# Altium schematic symbol library jlcpcb_2025_04_capacitors_extended_0201.schlib: 1175 symbols (part 4 of 7)
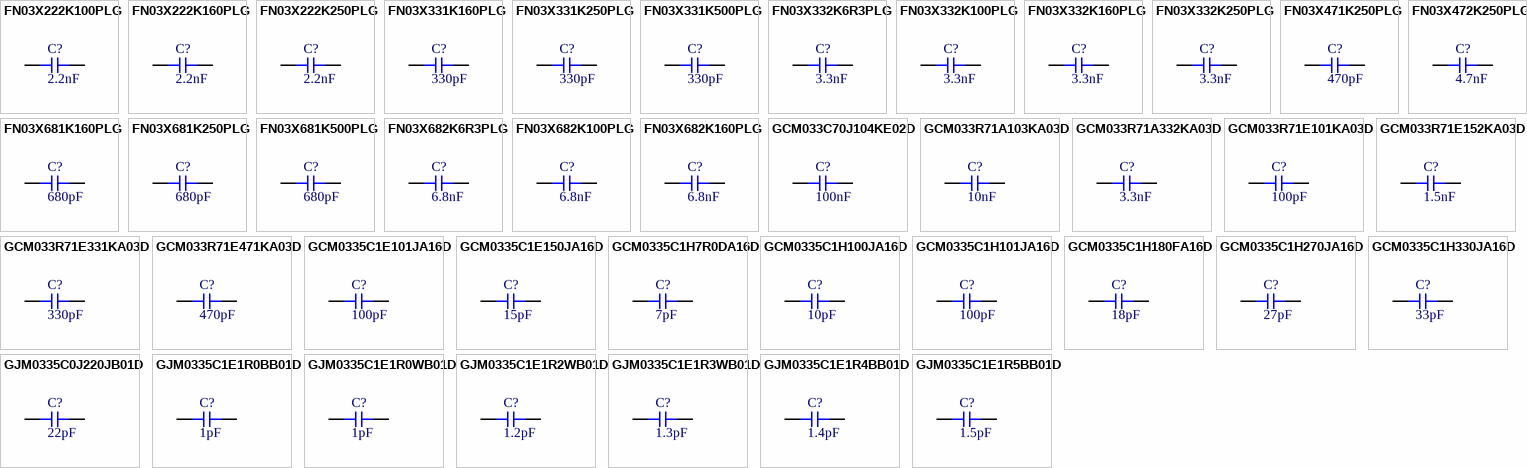
[diagram p32: symbols FN03X222K100PLG to GJM0335C1E1R5BB01D]

## GJM0335C1E1R0WB01D
designator C?  Capacitance: 1pF  (hidden comment: *)
Capacitor, Ceramic (MLCC), 1pF, 25V, C0G, SMD 0201; Manufacturer: Murata Electronics; Manufacturer Part Number: GJM0335C1E1R0WB01D; Package Size: 0201; JLCPCB Basic Part: No; JLCPCB Part Number: C185624; Supplier 1: LCSC; Category: Capacitors - MLCC; Supplier Part Number 1: C185624; Voltage Rating: 25V; Temperature Coefficient: C0G; RoHS: Yes; ComponentLink1Description: Datasheet; ComponentLink1URL: https://wmsc.lcsc.com/wmsc/upload/file/pdf/v2/lcsc/1811081545_Murata-Electronics-GJM0335C1E1R0WB01D_C185624.pdf; ComponentLink2Description: JLCPCB Part URL; ComponentLink2URL: https://jlcpcb.com/partdetail/C185624; ComponentLink3Description: LCSC Part URL; ComponentLink3URL: https://lcsc.com/product-detail/Multilayer-Ceramic-Capacitors-MLCC---SMD-SMT_Murata-Electronics-Murata-Electronics-GJM0335C1E1R0WB01D_C185624.html
footprint CAP-0201 (0201 (0603M) Capacitor)
pins: 1, 2

## GJM0335C1E1R2WB01D
designator C?  Capacitance: 1.2pF  (hidden comment: *)
Capacitor, Ceramic (MLCC), 1.2pF, 25V, null, SMD 0201; Manufacturer: Murata Electronics; Manufacturer Part Number: GJM0335C1E1R2WB01D; Package Size: 0201; JLCPCB Basic Part: No; JLCPCB Part Number: C710725; Supplier 1: LCSC; Category: Capacitors - MLCC; Supplier Part Number 1: C710725; Voltage Rating: 25V; Temperature Coefficient: null; RoHS: Yes; ComponentLink1Description: Datasheet; ComponentLink1URL: https://wmsc.lcsc.com/wmsc/upload/file/pdf/v2/lcsc/2009101807_Murata-Electronics-GJM0335C1E1R2WB01D_C710725.pdf; ComponentLink2Description: JLCPCB Part URL; ComponentLink2URL: https://jlcpcb.com/partdetail/C710725; ComponentLink3Description: LCSC Part URL; ComponentLink3URL: https://lcsc.com/product-detail/Multilayer-Ceramic-Capacitors-MLCC---SMD-SMT_Murata-Electronics-Murata-Electronics-GJM0335C1E1R2WB01D_C710725.html
footprint CAP-0201 (0201 (0603M) Capacitor)
pins: 1, 2

## GJM0335C1E1R3WB01D
designator C?  Capacitance: 1.3pF  (hidden comment: *)
Capacitor, Ceramic (MLCC), 1.3pF, 25V, null, SMD 0201; Manufacturer: Murata Electronics; Manufacturer Part Number: GJM0335C1E1R3WB01D; Package Size: 0201; JLCPCB Basic Part: No; JLCPCB Part Number: C710726; Supplier 1: LCSC; Category: Capacitors - MLCC; Supplier Part Number 1: C710726; Voltage Rating: 25V; Temperature Coefficient: null; RoHS: Yes; ComponentLink1Description: Datasheet; ComponentLink1URL: https://wmsc.lcsc.com/wmsc/upload/file/pdf/v2/lcsc/2103241949_Murata-Electronics-GJM0335C1E1R3WB01D_C710726.pdf; ComponentLink2Description: JLCPCB Part URL; ComponentLink2URL: https://jlcpcb.com/partdetail/C710726; ComponentLink3Description: LCSC Part URL; ComponentLink3URL: https://lcsc.com/product-detail/Multilayer-Ceramic-Capacitors-MLCC---SMD-SMT_Murata-Electronics-Murata-Electronics-GJM0335C1E1R3WB01D_C710726.html
footprint CAP-0201 (0201 (0603M) Capacitor)
pins: 1, 2

## GJM0335C1E1R4BB01D
designator C?  Capacitance: 1.4pF  (hidden comment: *)
Capacitor, Ceramic (MLCC), 1.4pF, 25V, C0G, SMD 0201; Manufacturer: Murata Electronics; Manufacturer Part Number: GJM0335C1E1R4BB01D; Package Size: 0201; JLCPCB Basic Part: No; JLCPCB Part Number: C711578; Supplier 1: LCSC; Category: Capacitors - MLCC; Supplier Part Number 1: C711578; Voltage Rating: 25V; Temperature Coefficient: C0G; RoHS: Yes; ComponentLink1Description: Datasheet; ComponentLink1URL: https://wmsc.lcsc.com/wmsc/upload/file/pdf/v2/lcsc/2008261937_Murata-Electronics-GJM0335C1E1R4BB01D_C711578.pdf; ComponentLink2Description: JLCPCB Part URL; ComponentLink2URL: https://jlcpcb.com/partdetail/C711578; ComponentLink3Description: LCSC Part URL; ComponentLink3URL: https://lcsc.com/product-detail/Multilayer-Ceramic-Capacitors-MLCC---SMD-SMT_Murata-Electronics-Murata-Electronics-GJM0335C1E1R4BB01D_C711578.html
footprint CAP-0201 (0201 (0603M) Capacitor)
pins: 1, 2

## GJM0335C1E1R5BB01D
designator C?  Capacitance: 1.5pF  (hidden comment: *)
Capacitor, Ceramic (MLCC), 1.5pF, 25V, C0G, SMD 0201; Manufacturer: Murata Electronics; Manufacturer Part Number: GJM0335C1E1R5BB01D; Package Size: 0201; JLCPCB Basic Part: No; JLCPCB Part Number: C161283; Supplier 1: LCSC; Category: Capacitors - MLCC; Supplier Part Number 1: C161283; Voltage Rating: 25V; Temperature Coefficient: C0G; RoHS: Yes; ComponentLink1Description: Datasheet; ComponentLink1URL: https://wmsc.lcsc.com/wmsc/upload/file/pdf/v2/lcsc/2304140030_Murata-Electronics-GJM0335C1E1R5BB01D_C161283.pdf; ComponentLink2Description: JLCPCB Part URL; ComponentLink2URL: https://jlcpcb.com/partdetail/C161283; ComponentLink3Description: LCSC Part URL; ComponentLink3URL: https://lcsc.com/product-detail/Multilayer-Ceramic-Capacitors-MLCC---SMD-SMT_Murata-Electronics-Murata-Electronics-GJM0335C1E1R5BB01D_C161283.html
footprint CAP-0201 (0201 (0603M) Capacitor)
pins: 1, 2

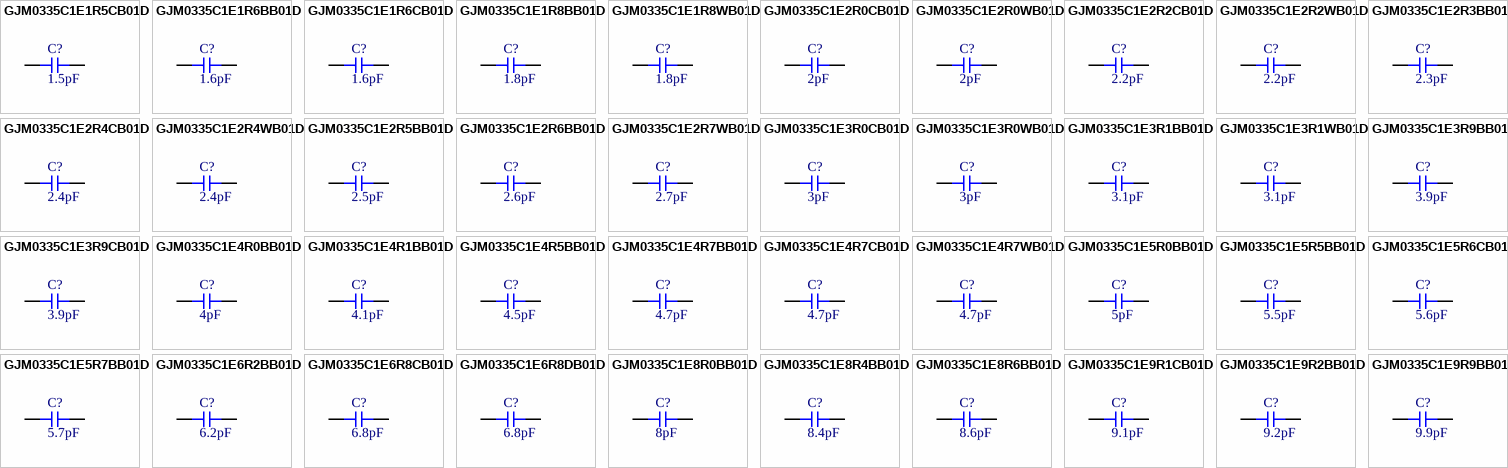
[diagram p14: symbols GJM0335C1E1R5CB01D to GJM0335C1E9R9BB01D]

## GJM0335C1E1R5CB01D
designator C?  Capacitance: 1.5pF  (hidden comment: *)
Capacitor, Ceramic (MLCC), 1.5pF, SMD 0201; Manufacturer: Murata Electronics; Manufacturer Part Number: GJM0335C1E1R5CB01D; Package Size: 0201; JLCPCB Basic Part: No; JLCPCB Part Number: C426037; Supplier 1: LCSC; Category: Capacitors - MLCC; Supplier Part Number 1: C426037; RoHS: Yes; ComponentLink1Description: Datasheet; ComponentLink1URL: https://wmsc.lcsc.com/wmsc/upload/file/pdf/v2/lcsc/2304140030_Murata-Electronics-GJM0335C1E1R5CB01D_C426037.pdf; ComponentLink2Description: JLCPCB Part URL; ComponentLink2URL: https://jlcpcb.com/partdetail/C426037; ComponentLink3Description: LCSC Part URL; ComponentLink3URL: https://lcsc.com/product-detail/Multilayer-Ceramic-Capacitors-MLCC---SMD-SMT_Murata-Electronics-Murata-Electronics-GJM0335C1E1R5CB01D_C426037.html
footprint CAP-0201 (0201 (0603M) Capacitor)
pins: 1, 2

## GJM0335C1E1R6BB01D
designator C?  Capacitance: 1.6pF  (hidden comment: *)
Capacitor, Ceramic (MLCC), 1.6pF, 25V, C0G, SMD 0201; Manufacturer: Murata Electronics; Manufacturer Part Number: GJM0335C1E1R6BB01D; Package Size: 0201; JLCPCB Basic Part: No; JLCPCB Part Number: C161284; Supplier 1: LCSC; Category: Capacitors - MLCC; Supplier Part Number 1: C161284; Voltage Rating: 25V; Temperature Coefficient: C0G; RoHS: Yes; ComponentLink1Description: Datasheet; ComponentLink1URL: https://wmsc.lcsc.com/wmsc/upload/file/pdf/v2/lcsc/2304140030_Murata-Electronics-GJM0335C1E1R6BB01D_C161284.pdf; ComponentLink2Description: JLCPCB Part URL; ComponentLink2URL: https://jlcpcb.com/partdetail/C161284; ComponentLink3Description: LCSC Part URL; ComponentLink3URL: https://lcsc.com/product-detail/Multilayer-Ceramic-Capacitors-MLCC---SMD-SMT_Murata-Electronics-Murata-Electronics-GJM0335C1E1R6BB01D_C161284.html
footprint CAP-0201 (0201 (0603M) Capacitor)
pins: 1, 2

## GJM0335C1E1R6CB01D
designator C?  Capacitance: 1.6pF  (hidden comment: *)
Capacitor, Ceramic (MLCC), 1.6pF, 2.5V, C0G, SMD 0201; Manufacturer: Murata Electronics; Manufacturer Part Number: GJM0335C1E1R6CB01D; Package Size: 0201; JLCPCB Basic Part: No; JLCPCB Part Number: C2931056; Supplier 1: LCSC; Category: Capacitors - MLCC; Supplier Part Number 1: C2931056; Voltage Rating: 2.5V; Temperature Coefficient: C0G; RoHS: Yes; ComponentLink1Description: Datasheet; ComponentLink1URL: https://wmsc.lcsc.com/wmsc/upload/file/pdf/v2/lcsc/2202161830_Murata-Electronics-GJM0335C1E1R6CB01D_C2931056.pdf; ComponentLink2Description: JLCPCB Part URL; ComponentLink2URL: https://jlcpcb.com/partdetail/C2931056; ComponentLink3Description: LCSC Part URL; ComponentLink3URL: https://lcsc.com/product-detail/Multilayer-Ceramic-Capacitors-MLCC---SMD-SMT_Murata-Electronics-Murata-Electronics-GJM0335C1E1R6CB01D_C2931056.html
footprint CAP-0201 (0201 (0603M) Capacitor)
pins: 1, 2

## GJM0335C1E1R8BB01D
designator C?  Capacitance: 1.8pF  (hidden comment: *)
Capacitor, Ceramic (MLCC), 1.8pF, 25V, C0G, SMD 0201; Manufacturer: Murata Electronics; Manufacturer Part Number: GJM0335C1E1R8BB01D; Package Size: 0201; JLCPCB Basic Part: No; JLCPCB Part Number: C88874; Supplier 1: LCSC; Category: Capacitors - MLCC; Supplier Part Number 1: C88874; Voltage Rating: 25V; Temperature Coefficient: C0G; RoHS: Yes; ComponentLink1Description: Datasheet; ComponentLink1URL: https://wmsc.lcsc.com/wmsc/upload/file/pdf/v2/lcsc/2304140030_Murata-Electronics-GJM0335C1E1R8BB01D_C88874.pdf; ComponentLink2Description: JLCPCB Part URL; ComponentLink2URL: https://jlcpcb.com/partdetail/C88874; ComponentLink3Description: LCSC Part URL; ComponentLink3URL: https://lcsc.com/product-detail/Multilayer-Ceramic-Capacitors-MLCC---SMD-SMT_Murata-Electronics-Murata-Electronics-GJM0335C1E1R8BB01D_C88874.html
footprint CAP-0201 (0201 (0603M) Capacitor)
pins: 1, 2

## GJM0335C1E1R8WB01D
designator C?  Capacitance: 1.8pF  (hidden comment: *)
Capacitor, Ceramic (MLCC), 1.8pF, 25V, null, SMD 0201; Manufacturer: Murata Electronics; Manufacturer Part Number: GJM0335C1E1R8WB01D; Package Size: 0201; JLCPCB Basic Part: No; JLCPCB Part Number: C237271; Supplier 1: LCSC; Category: Capacitors - MLCC; Supplier Part Number 1: C237271; Voltage Rating: 25V; Temperature Coefficient: null; RoHS: Yes; ComponentLink1Description: Datasheet; ComponentLink1URL: https://wmsc.lcsc.com/wmsc/upload/file/pdf/v2/lcsc/2009101807_Murata-Electronics-GJM0335C1E1R8WB01D_C237271.pdf; ComponentLink2Description: JLCPCB Part URL; ComponentLink2URL: https://jlcpcb.com/partdetail/C237271; ComponentLink3Description: LCSC Part URL; ComponentLink3URL: https://lcsc.com/product-detail/Multilayer-Ceramic-Capacitors-MLCC---SMD-SMT_Murata-Electronics-Murata-Electronics-GJM0335C1E1R8WB01D_C237271.html
footprint CAP-0201 (0201 (0603M) Capacitor)
pins: 1, 2

## GJM0335C1E2R0CB01D
designator C?  Capacitance: 2pF  (hidden comment: *)
Capacitor, Ceramic (MLCC), 2pF, 25V, null, SMD 0201; Manufacturer: Murata Electronics; Manufacturer Part Number: GJM0335C1E2R0CB01D; Package Size: 0201; JLCPCB Basic Part: No; JLCPCB Part Number: C426046; Supplier 1: LCSC; Category: Capacitors - MLCC; Supplier Part Number 1: C426046; Voltage Rating: 25V; Temperature Coefficient: null; RoHS: Yes; ComponentLink1Description: Datasheet; ComponentLink1URL: https://wmsc.lcsc.com/wmsc/upload/file/pdf/v2/lcsc/2304140030_Murata-Electronics-GJM0335C1E2R0CB01D_C426046.pdf; ComponentLink2Description: JLCPCB Part URL; ComponentLink2URL: https://jlcpcb.com/partdetail/C426046; ComponentLink3Description: LCSC Part URL; ComponentLink3URL: https://lcsc.com/product-detail/Multilayer-Ceramic-Capacitors-MLCC---SMD-SMT_Murata-Electronics-Murata-Electronics-GJM0335C1E2R0CB01D_C426046.html
footprint CAP-0201 (0201 (0603M) Capacitor)
pins: 1, 2

## GJM0335C1E2R0WB01D
designator C?  Capacitance: 2pF  (hidden comment: *)
Capacitor, Ceramic (MLCC), 2pF, 25V, C0G, SMD 0201; Manufacturer: Murata Electronics; Manufacturer Part Number: GJM0335C1E2R0WB01D; Package Size: 0201; JLCPCB Basic Part: No; JLCPCB Part Number: C668326; Supplier 1: LCSC; Category: Capacitors - MLCC; Supplier Part Number 1: C668326; Voltage Rating: 25V; Temperature Coefficient: C0G; RoHS: Yes; ComponentLink1Description: Datasheet; ComponentLink1URL: https://wmsc.lcsc.com/wmsc/upload/file/pdf/v2/lcsc/2202161830_Murata-Electronics-GJM0335C1E2R0WB01D_C668326.pdf; ComponentLink2Description: JLCPCB Part URL; ComponentLink2URL: https://jlcpcb.com/partdetail/C668326; ComponentLink3Description: LCSC Part URL; ComponentLink3URL: https://lcsc.com/product-detail/Multilayer-Ceramic-Capacitors-MLCC---SMD-SMT_Murata-Electronics-Murata-Electronics-GJM0335C1E2R0WB01D_C668326.html
footprint CAP-0201 (0201 (0603M) Capacitor)
pins: 1, 2

## GJM0335C1E2R2CB01D
designator C?  Capacitance: 2.2pF  (hidden comment: *)
Capacitor, Ceramic (MLCC), 2.2pF, 25V, null, SMD 0201; Manufacturer: Murata Electronics; Manufacturer Part Number: GJM0335C1E2R2CB01D; Package Size: 0201; JLCPCB Basic Part: No; JLCPCB Part Number: C710731; Supplier 1: LCSC; Category: Capacitors - MLCC; Supplier Part Number 1: C710731; Voltage Rating: 25V; Temperature Coefficient: null; RoHS: Yes; ComponentLink1Description: Datasheet; ComponentLink1URL: https://wmsc.lcsc.com/wmsc/upload/file/pdf/v2/lcsc/2103161034_Murata-Electronics-GJM0335C1E2R2CB01D_C710731.pdf; ComponentLink2Description: JLCPCB Part URL; ComponentLink2URL: https://jlcpcb.com/partdetail/C710731; ComponentLink3Description: LCSC Part URL; ComponentLink3URL: https://lcsc.com/product-detail/Multilayer-Ceramic-Capacitors-MLCC---SMD-SMT_Murata-Electronics-Murata-Electronics-GJM0335C1E2R2CB01D_C710731.html
footprint CAP-0201 (0201 (0603M) Capacitor)
pins: 1, 2

## GJM0335C1E2R2WB01D
designator C?  Capacitance: 2.2pF  (hidden comment: *)
Capacitor, Ceramic (MLCC), 2.2pF, 25V, null, SMD 0201; Manufacturer: Murata Electronics; Manufacturer Part Number: GJM0335C1E2R2WB01D; Package Size: 0201; JLCPCB Basic Part: No; JLCPCB Part Number: C710732; Supplier 1: LCSC; Category: Capacitors - MLCC; Supplier Part Number 1: C710732; Voltage Rating: 25V; Temperature Coefficient: null; RoHS: Yes; ComponentLink1Description: Datasheet; ComponentLink1URL: https://wmsc.lcsc.com/wmsc/upload/file/pdf/v2/lcsc/2009101807_Murata-Electronics-GJM0335C1E2R2WB01D_C710732.pdf; ComponentLink2Description: JLCPCB Part URL; ComponentLink2URL: https://jlcpcb.com/partdetail/C710732; ComponentLink3Description: LCSC Part URL; ComponentLink3URL: https://lcsc.com/product-detail/Multilayer-Ceramic-Capacitors-MLCC---SMD-SMT_Murata-Electronics-Murata-Electronics-GJM0335C1E2R2WB01D_C710732.html
footprint CAP-0201 (0201 (0603M) Capacitor)
pins: 1, 2

## GJM0335C1E2R3BB01D
designator C?  Capacitance: 2.3pF  (hidden comment: *)
Capacitor, Ceramic (MLCC), 2.3pF, 25V, C0G, SMD 0201; Manufacturer: Murata Electronics; Manufacturer Part Number: GJM0335C1E2R3BB01D; Package Size: 0201; JLCPCB Basic Part: No; JLCPCB Part Number: C710733; Supplier 1: LCSC; Category: Capacitors - MLCC; Supplier Part Number 1: C710733; Voltage Rating: 25V; Temperature Coefficient: C0G; RoHS: Yes; ComponentLink1Description: Datasheet; ComponentLink1URL: https://wmsc.lcsc.com/wmsc/upload/file/pdf/v2/lcsc/2203221230_Murata-Electronics-GJM0335C1E2R3BB01D_C710733.pdf; ComponentLink2Description: JLCPCB Part URL; ComponentLink2URL: https://jlcpcb.com/partdetail/C710733; ComponentLink3Description: LCSC Part URL; ComponentLink3URL: https://lcsc.com/product-detail/Multilayer-Ceramic-Capacitors-MLCC---SMD-SMT_Murata-Electronics-Murata-Electronics-GJM0335C1E2R3BB01D_C710733.html
footprint CAP-0201 (0201 (0603M) Capacitor)
pins: 1, 2

## GJM0335C1E2R4CB01D
designator C?  Capacitance: 2.4pF  (hidden comment: *)
Capacitor, Ceramic (MLCC), 2.4pF, 25V, null, SMD 0201; Manufacturer: Murata Electronics; Manufacturer Part Number: GJM0335C1E2R4CB01D; Package Size: 0201; JLCPCB Basic Part: No; JLCPCB Part Number: C913660; Supplier 1: LCSC; Category: Capacitors - MLCC; Supplier Part Number 1: C913660; Voltage Rating: 25V; Temperature Coefficient: null; RoHS: Yes; ComponentLink1Description: Datasheet; ComponentLink1URL: https://wmsc.lcsc.com/wmsc/upload/file/pdf/v2/lcsc/2308111614_Murata-Electronics-GJM0335C1E2R4CB01D_C913660.pdf; ComponentLink2Description: JLCPCB Part URL; ComponentLink2URL: https://jlcpcb.com/partdetail/C913660; ComponentLink3Description: LCSC Part URL; ComponentLink3URL: https://lcsc.com/product-detail/Multilayer-Ceramic-Capacitors-MLCC---SMD-SMT_Murata-Electronics-Murata-Electronics-GJM0335C1E2R4CB01D_C913660.html
footprint CAP-0201 (0201 (0603M) Capacitor)
pins: 1, 2

## GJM0335C1E2R4WB01D
designator C?  Capacitance: 2.4pF  (hidden comment: *)
Capacitor, Ceramic (MLCC), 2.4pF, 25V, null, SMD 0201; Manufacturer: Murata Electronics; Manufacturer Part Number: GJM0335C1E2R4WB01D; Package Size: 0201; JLCPCB Basic Part: No; JLCPCB Part Number: C668327; Supplier 1: LCSC; Category: Capacitors - MLCC; Supplier Part Number 1: C668327; Voltage Rating: 25V; Temperature Coefficient: null; RoHS: Yes; ComponentLink1Description: Datasheet; ComponentLink1URL: https://wmsc.lcsc.com/wmsc/upload/file/pdf/v2/lcsc/2201051730_Murata-Electronics-GJM0335C1E2R4WB01D_C668327.pdf; ComponentLink2Description: JLCPCB Part URL; ComponentLink2URL: https://jlcpcb.com/partdetail/C668327; ComponentLink3Description: LCSC Part URL; ComponentLink3URL: https://lcsc.com/product-detail/Multilayer-Ceramic-Capacitors-MLCC---SMD-SMT_Murata-Electronics-Murata-Electronics-GJM0335C1E2R4WB01D_C668327.html
footprint CAP-0201 (0201 (0603M) Capacitor)
pins: 1, 2

## GJM0335C1E2R5BB01D
designator C?  Capacitance: 2.5pF  (hidden comment: *)
Capacitor, Ceramic (MLCC), 2.5pF, 25V, C0G, SMD 0201; Manufacturer: Murata Electronics; Manufacturer Part Number: GJM0335C1E2R5BB01D; Package Size: 0201; JLCPCB Basic Part: No; JLCPCB Part Number: C710734; Supplier 1: LCSC; Category: Capacitors - MLCC; Supplier Part Number 1: C710734; Voltage Rating: 25V; Temperature Coefficient: C0G; RoHS: Yes; ComponentLink1Description: Datasheet; ComponentLink1URL: https://wmsc.lcsc.com/wmsc/upload/file/pdf/v2/lcsc/2108241530_Murata-Electronics-GJM0335C1E2R5BB01D_C710734.pdf; ComponentLink2Description: JLCPCB Part URL; ComponentLink2URL: https://jlcpcb.com/partdetail/C710734; ComponentLink3Description: LCSC Part URL; ComponentLink3URL: https://lcsc.com/product-detail/Multilayer-Ceramic-Capacitors-MLCC---SMD-SMT_Murata-Electronics-Murata-Electronics-GJM0335C1E2R5BB01D_C710734.html
footprint CAP-0201 (0201 (0603M) Capacitor)
pins: 1, 2

## GJM0335C1E2R6BB01D
designator C?  Capacitance: 2.6pF  (hidden comment: *)
Capacitor, Ceramic (MLCC), 2.6pF, 25V, SMD 0201; Manufacturer: Murata Electronics; Manufacturer Part Number: GJM0335C1E2R6BB01D; Package Size: 0201; JLCPCB Basic Part: No; JLCPCB Part Number: C2981739; Supplier 1: LCSC; Category: Capacitors - MLCC; Supplier Part Number 1: C2981739; Voltage Rating: 25V; RoHS: Yes; ComponentLink1Description: Datasheet; ComponentLink1URL: https://wmsc.lcsc.com/wmsc/upload/file/pdf/v2/lcsc/2203221030_Murata-Electronics-GJM0335C1E2R6BB01D_C2981739.pdf; ComponentLink2Description: JLCPCB Part URL; ComponentLink2URL: https://jlcpcb.com/partdetail/C2981739; ComponentLink3Description: LCSC Part URL; ComponentLink3URL: https://lcsc.com/product-detail/Multilayer-Ceramic-Capacitors-MLCC---SMD-SMT_Murata-Electronics-Murata-Electronics-GJM0335C1E2R6BB01D_C2981739.html
footprint CAP-0201 (0201 (0603M) Capacitor)
pins: 1, 2

## GJM0335C1E2R7WB01D
designator C?  Capacitance: 2.7pF  (hidden comment: *)
Capacitor, Ceramic (MLCC), 2.7pF, 25V, null, SMD 0201; Manufacturer: Murata Electronics; Manufacturer Part Number: GJM0335C1E2R7WB01D; Package Size: 0201; JLCPCB Basic Part: No; JLCPCB Part Number: C1852417; Supplier 1: LCSC; Category: Capacitors - MLCC; Supplier Part Number 1: C1852417; Voltage Rating: 25V; Temperature Coefficient: null; RoHS: Yes; ComponentLink1Description: Datasheet; ComponentLink1URL: https://wmsc.lcsc.com/wmsc/upload/file/pdf/v2/lcsc/2104061713_Murata-Electronics-GJM0335C1E2R7WB01D_C1852417.pdf; ComponentLink2Description: JLCPCB Part URL; ComponentLink2URL: https://jlcpcb.com/partdetail/C1852417; ComponentLink3Description: LCSC Part URL; ComponentLink3URL: https://lcsc.com/product-detail/Multilayer-Ceramic-Capacitors-MLCC---SMD-SMT_Murata-Electronics-Murata-Electronics-GJM0335C1E2R7WB01D_C1852417.html
footprint CAP-0201 (0201 (0603M) Capacitor)
pins: 1, 2

## GJM0335C1E3R0CB01D
designator C?  Capacitance: 3pF  (hidden comment: *)
Capacitor, Ceramic (MLCC), 3pF, 25V, null, SMD 0201; Manufacturer: Murata Electronics; Manufacturer Part Number: GJM0335C1E3R0CB01D; Package Size: 0201; JLCPCB Basic Part: No; JLCPCB Part Number: C701301; Supplier 1: LCSC; Category: Capacitors - MLCC; Supplier Part Number 1: C701301; Voltage Rating: 25V; Temperature Coefficient: null; RoHS: Yes; ComponentLink1Description: Datasheet; ComponentLink1URL: https://wmsc.lcsc.com/wmsc/upload/file/pdf/v2/lcsc/2201131100_Murata-Electronics-GJM0335C1E3R0CB01D_C701301.pdf; ComponentLink2Description: JLCPCB Part URL; ComponentLink2URL: https://jlcpcb.com/partdetail/C701301; ComponentLink3Description: LCSC Part URL; ComponentLink3URL: https://lcsc.com/product-detail/Multilayer-Ceramic-Capacitors-MLCC---SMD-SMT_Murata-Electronics-Murata-Electronics-GJM0335C1E3R0CB01D_C701301.html
footprint CAP-0201 (0201 (0603M) Capacitor)
pins: 1, 2

## GJM0335C1E3R0WB01D
designator C?  Capacitance: 3pF  (hidden comment: *)
Capacitor, Ceramic (MLCC), 3pF, 25V, null, SMD 0201; Manufacturer: Murata Electronics; Manufacturer Part Number: GJM0335C1E3R0WB01D; Package Size: 0201; JLCPCB Basic Part: No; JLCPCB Part Number: C710736; Supplier 1: LCSC; Category: Capacitors - MLCC; Supplier Part Number 1: C710736; Voltage Rating: 25V; Temperature Coefficient: null; RoHS: Yes; ComponentLink1Description: Datasheet; ComponentLink1URL: https://wmsc.lcsc.com/wmsc/upload/file/pdf/v2/lcsc/2009181535_Murata-Electronics-GJM0335C1E3R0WB01D_C710736.pdf; ComponentLink2Description: JLCPCB Part URL; ComponentLink2URL: https://jlcpcb.com/partdetail/C710736; ComponentLink3Description: LCSC Part URL; ComponentLink3URL: https://lcsc.com/product-detail/Multilayer-Ceramic-Capacitors-MLCC---SMD-SMT_Murata-Electronics-Murata-Electronics-GJM0335C1E3R0WB01D_C710736.html
footprint CAP-0201 (0201 (0603M) Capacitor)
pins: 1, 2

## GJM0335C1E3R1BB01D
designator C?  Capacitance: 3.1pF  (hidden comment: *)
Capacitor, Ceramic (MLCC), 3.1pF, 25V, null, SMD 0201; Manufacturer: Murata Electronics; Manufacturer Part Number: GJM0335C1E3R1BB01D; Package Size: 0201; JLCPCB Basic Part: No; JLCPCB Part Number: C2181233; Supplier 1: LCSC; Category: Capacitors - MLCC; Supplier Part Number 1: C2181233; Voltage Rating: 25V; Temperature Coefficient: null; RoHS: Yes; ComponentLink1Description: Datasheet; ComponentLink1URL: https://wmsc.lcsc.com/wmsc/upload/file/pdf/v2/lcsc/2202041200_Murata-Electronics-GJM0335C1E3R1BB01D_C2181233.pdf; ComponentLink2Description: JLCPCB Part URL; ComponentLink2URL: https://jlcpcb.com/partdetail/C2181233; ComponentLink3Description: LCSC Part URL; ComponentLink3URL: https://lcsc.com/product-detail/Multilayer-Ceramic-Capacitors-MLCC---SMD-SMT_Murata-Electronics-Murata-Electronics-GJM0335C1E3R1BB01D_C2181233.html
footprint CAP-0201 (0201 (0603M) Capacitor)
pins: 1, 2

## GJM0335C1E3R1WB01D
designator C?  Capacitance: 3.1pF  (hidden comment: *)
Capacitor, Ceramic (MLCC), 3.1pF, 25V, null, SMD 0201; Manufacturer: Murata Electronics; Manufacturer Part Number: GJM0335C1E3R1WB01D; Package Size: 0201; JLCPCB Basic Part: No; JLCPCB Part Number: C2199607; Supplier 1: LCSC; Category: Capacitors - MLCC; Supplier Part Number 1: C2199607; Voltage Rating: 25V; Temperature Coefficient: null; RoHS: Yes; ComponentLink1Description: Datasheet; ComponentLink1URL: https://wmsc.lcsc.com/wmsc/upload/file/pdf/v2/lcsc/2202050330_Murata-Electronics-GJM0335C1E3R1WB01D_C2199607.pdf; ComponentLink2Description: JLCPCB Part URL; ComponentLink2URL: https://jlcpcb.com/partdetail/C2199607; ComponentLink3Description: LCSC Part URL; ComponentLink3URL: https://lcsc.com/product-detail/Multilayer-Ceramic-Capacitors-MLCC---SMD-SMT_Murata-Electronics-Murata-Electronics-GJM0335C1E3R1WB01D_C2199607.html
footprint CAP-0201 (0201 (0603M) Capacitor)
pins: 1, 2

## GJM0335C1E3R9BB01D
designator C?  Capacitance: 3.9pF  (hidden comment: *)
Capacitor, Ceramic (MLCC), 3.9pF, SMD 0201; Manufacturer: Murata Electronics; Manufacturer Part Number: GJM0335C1E3R9BB01D; Package Size: 0201; JLCPCB Basic Part: No; JLCPCB Part Number: C237585; Supplier 1: LCSC; Category: Capacitors - MLCC; Supplier Part Number 1: C237585; RoHS: Yes; ComponentLink1Description: Datasheet; ComponentLink1URL: https://wmsc.lcsc.com/wmsc/upload/file/pdf/v2/lcsc/2105241142_Murata-Electronics-GJM0335C1E3R9BB01D_C237585.pdf; ComponentLink2Description: JLCPCB Part URL; ComponentLink2URL: https://jlcpcb.com/partdetail/C237585; ComponentLink3Description: LCSC Part URL; ComponentLink3URL: https://lcsc.com/product-detail/Multilayer-Ceramic-Capacitors-MLCC---SMD-SMT_Murata-Electronics-Murata-Electronics-GJM0335C1E3R9BB01D_C237585.html
footprint CAP-0201 (0201 (0603M) Capacitor)
pins: 1, 2

## GJM0335C1E3R9CB01D
designator C?  Capacitance: 3.9pF  (hidden comment: *)
Capacitor, Ceramic (MLCC), 3.9pF, 25V, null, SMD 0201; Manufacturer: Murata Electronics; Manufacturer Part Number: GJM0335C1E3R9CB01D; Package Size: 0201; JLCPCB Basic Part: No; JLCPCB Part Number: C2171412; Supplier 1: LCSC; Category: Capacitors - MLCC; Supplier Part Number 1: C2171412; Voltage Rating: 25V; Temperature Coefficient: null; RoHS: Yes; ComponentLink1Description: Datasheet; ComponentLink1URL: https://wmsc.lcsc.com/wmsc/upload/file/pdf/v2/lcsc/2202040500_Murata-Electronics-GJM0335C1E3R9CB01D_C2171412.pdf; ComponentLink2Description: JLCPCB Part URL; ComponentLink2URL: https://jlcpcb.com/partdetail/C2171412; ComponentLink3Description: LCSC Part URL; ComponentLink3URL: https://lcsc.com/product-detail/Multilayer-Ceramic-Capacitors-MLCC---SMD-SMT_Murata-Electronics-Murata-Electronics-GJM0335C1E3R9CB01D_C2171412.html
footprint CAP-0201 (0201 (0603M) Capacitor)
pins: 1, 2

## GJM0335C1E4R0BB01D
designator C?  Capacitance: 4pF  (hidden comment: *)
Capacitor, Ceramic (MLCC), 4pF, 25V, null, SMD 0201; Manufacturer: Murata Electronics; Manufacturer Part Number: GJM0335C1E4R0BB01D; Package Size: 0201; JLCPCB Basic Part: No; JLCPCB Part Number: C710738; Supplier 1: LCSC; Category: Capacitors - MLCC; Supplier Part Number 1: C710738; Voltage Rating: 25V; Temperature Coefficient: null; RoHS: Yes; ComponentLink1Description: Datasheet; ComponentLink1URL: https://wmsc.lcsc.com/wmsc/upload/file/pdf/v2/lcsc/2103161034_Murata-Electronics-GJM0335C1E4R0BB01D_C710738.pdf; ComponentLink2Description: JLCPCB Part URL; ComponentLink2URL: https://jlcpcb.com/partdetail/C710738; ComponentLink3Description: LCSC Part URL; ComponentLink3URL: https://lcsc.com/product-detail/Multilayer-Ceramic-Capacitors-MLCC---SMD-SMT_Murata-Electronics-Murata-Electronics-GJM0335C1E4R0BB01D_C710738.html
footprint CAP-0201 (0201 (0603M) Capacitor)
pins: 1, 2

## GJM0335C1E4R1BB01D
designator C?  Capacitance: 4.1pF  (hidden comment: *)
Capacitor, Ceramic (MLCC), 4.1pF, 25V, C0G, SMD 0201; Manufacturer: Murata Electronics; Manufacturer Part Number: GJM0335C1E4R1BB01D; Package Size: 0201; JLCPCB Basic Part: No; JLCPCB Part Number: C2981738; Supplier 1: LCSC; Category: Capacitors - MLCC; Supplier Part Number 1: C2981738; Voltage Rating: 25V; Temperature Coefficient: C0G; RoHS: Yes; ComponentLink1Description: Datasheet; ComponentLink1URL: https://wmsc.lcsc.com/wmsc/upload/file/pdf/v2/lcsc/2203221030_Murata-Electronics-GJM0335C1E4R1BB01D_C2981738.pdf; ComponentLink2Description: JLCPCB Part URL; ComponentLink2URL: https://jlcpcb.com/partdetail/C2981738; ComponentLink3Description: LCSC Part URL; ComponentLink3URL: https://lcsc.com/product-detail/Multilayer-Ceramic-Capacitors-MLCC---SMD-SMT_Murata-Electronics-Murata-Electronics-GJM0335C1E4R1BB01D_C2981738.html
footprint CAP-0201 (0201 (0603M) Capacitor)
pins: 1, 2

## GJM0335C1E4R5BB01D
designator C?  Capacitance: 4.5pF  (hidden comment: *)
Capacitor, Ceramic (MLCC), 4.5pF, 25V, C0G, SMD 0201; Manufacturer: Murata Electronics; Manufacturer Part Number: GJM0335C1E4R5BB01D; Package Size: 0201; JLCPCB Basic Part: No; JLCPCB Part Number: C710739; Supplier 1: LCSC; Category: Capacitors - MLCC; Supplier Part Number 1: C710739; Voltage Rating: 25V; Temperature Coefficient: C0G; RoHS: Yes; ComponentLink1Description: Datasheet; ComponentLink1URL: https://wmsc.lcsc.com/wmsc/upload/file/pdf/v2/lcsc/2203221230_Murata-Electronics-GJM0335C1E4R5BB01D_C710739.pdf; ComponentLink2Description: JLCPCB Part URL; ComponentLink2URL: https://jlcpcb.com/partdetail/C710739; ComponentLink3Description: LCSC Part URL; ComponentLink3URL: https://lcsc.com/product-detail/Multilayer-Ceramic-Capacitors-MLCC---SMD-SMT_Murata-Electronics-Murata-Electronics-GJM0335C1E4R5BB01D_C710739.html
footprint CAP-0201 (0201 (0603M) Capacitor)
pins: 1, 2

## GJM0335C1E4R7BB01D
designator C?  Capacitance: 4.7pF  (hidden comment: *)
Capacitor, Ceramic (MLCC), 4.7pF, 25V, C0G, SMD 0201; Manufacturer: Murata Electronics; Manufacturer Part Number: GJM0335C1E4R7BB01D; Package Size: 0201; JLCPCB Basic Part: No; JLCPCB Part Number: C88876; Supplier 1: LCSC; Category: Capacitors - MLCC; Supplier Part Number 1: C88876; Voltage Rating: 25V; Temperature Coefficient: C0G; RoHS: Yes; ComponentLink1Description: Datasheet; ComponentLink1URL: https://wmsc.lcsc.com/wmsc/upload/file/pdf/v2/lcsc/2304140030_Murata-Electronics-GJM0335C1E4R7BB01D_C88876.pdf; ComponentLink2Description: JLCPCB Part URL; ComponentLink2URL: https://jlcpcb.com/partdetail/C88876; ComponentLink3Description: LCSC Part URL; ComponentLink3URL: https://lcsc.com/product-detail/Multilayer-Ceramic-Capacitors-MLCC---SMD-SMT_Murata-Electronics-Murata-Electronics-GJM0335C1E4R7BB01D_C88876.html
footprint CAP-0201 (0201 (0603M) Capacitor)
pins: 1, 2

## GJM0335C1E4R7CB01D
designator C?  Capacitance: 4.7pF  (hidden comment: *)
Capacitor, Ceramic (MLCC), 4.7pF, 25V, C0G, SMD 0201; Manufacturer: Murata Electronics; Manufacturer Part Number: GJM0335C1E4R7CB01D; Package Size: 0201; JLCPCB Basic Part: No; JLCPCB Part Number: C426035; Supplier 1: LCSC; Category: Capacitors - MLCC; Supplier Part Number 1: C426035; Voltage Rating: 25V; Temperature Coefficient: C0G; RoHS: Yes; ComponentLink1Description: Datasheet; ComponentLink1URL: https://wmsc.lcsc.com/wmsc/upload/file/pdf/v2/lcsc/2304140030_Murata-Electronics-GJM0335C1E4R7CB01D_C426035.pdf; ComponentLink2Description: JLCPCB Part URL; ComponentLink2URL: https://jlcpcb.com/partdetail/C426035; ComponentLink3Description: LCSC Part URL; ComponentLink3URL: https://lcsc.com/product-detail/Multilayer-Ceramic-Capacitors-MLCC---SMD-SMT_Murata-Electronics-Murata-Electronics-GJM0335C1E4R7CB01D_C426035.html
footprint CAP-0201 (0201 (0603M) Capacitor)
pins: 1, 2

## GJM0335C1E4R7WB01D
designator C?  Capacitance: 4.7pF  (hidden comment: *)
Capacitor, Ceramic (MLCC), 4.7pF, 25V, null, SMD 0201; Manufacturer: Murata Electronics; Manufacturer Part Number: GJM0335C1E4R7WB01D; Package Size: 0201; JLCPCB Basic Part: No; JLCPCB Part Number: C1852419; Supplier 1: LCSC; Category: Capacitors - MLCC; Supplier Part Number 1: C1852419; Voltage Rating: 25V; Temperature Coefficient: null; RoHS: Yes; ComponentLink1Description: Datasheet; ComponentLink1URL: https://wmsc.lcsc.com/wmsc/upload/file/pdf/v2/lcsc/2304140030_Murata-Electronics-GJM0335C1E4R7WB01D_C1852419.pdf; ComponentLink2Description: JLCPCB Part URL; ComponentLink2URL: https://jlcpcb.com/partdetail/C1852419; ComponentLink3Description: LCSC Part URL; ComponentLink3URL: https://lcsc.com/product-detail/Multilayer-Ceramic-Capacitors-MLCC---SMD-SMT_Murata-Electronics-Murata-Electronics-GJM0335C1E4R7WB01D_C1852419.html
footprint CAP-0201 (0201 (0603M) Capacitor)
pins: 1, 2

## GJM0335C1E5R0BB01D
designator C?  Capacitance: 5pF  (hidden comment: *)
Capacitor, Ceramic (MLCC), 5pF, 25V, C0G, SMD 0201; Manufacturer: Murata Electronics; Manufacturer Part Number: GJM0335C1E5R0BB01D; Package Size: 0201; JLCPCB Basic Part: No; JLCPCB Part Number: C464954; Supplier 1: LCSC; Category: Capacitors - MLCC; Supplier Part Number 1: C464954; Voltage Rating: 25V; Temperature Coefficient: C0G; RoHS: Yes; ComponentLink1Description: Datasheet; ComponentLink1URL: https://wmsc.lcsc.com/wmsc/upload/file/pdf/v2/lcsc/1912111437_Murata-Electronics-GJM0335C1E5R0BB01D_C464954.pdf; ComponentLink2Description: JLCPCB Part URL; ComponentLink2URL: https://jlcpcb.com/partdetail/C464954; ComponentLink3Description: LCSC Part URL; ComponentLink3URL: https://lcsc.com/product-detail/Multilayer-Ceramic-Capacitors-MLCC---SMD-SMT_Murata-Electronics-Murata-Electronics-GJM0335C1E5R0BB01D_C464954.html
footprint CAP-0201 (0201 (0603M) Capacitor)
pins: 1, 2

## GJM0335C1E5R5BB01D
designator C?  Capacitance: 5.5pF  (hidden comment: *)
Capacitor, Ceramic (MLCC), 5.5pF, 25V, null, SMD 0201; Manufacturer: Murata Electronics; Manufacturer Part Number: GJM0335C1E5R5BB01D; Package Size: 0201; JLCPCB Basic Part: No; JLCPCB Part Number: C2187712; Supplier 1: LCSC; Category: Capacitors - MLCC; Supplier Part Number 1: C2187712; Voltage Rating: 25V; Temperature Coefficient: null; RoHS: Yes; ComponentLink1Description: Datasheet; ComponentLink1URL: https://wmsc.lcsc.com/wmsc/upload/file/pdf/v2/lcsc/2202041700_Murata-Electronics-GJM0335C1E5R5BB01D_C2187712.pdf; ComponentLink2Description: JLCPCB Part URL; ComponentLink2URL: https://jlcpcb.com/partdetail/C2187712; ComponentLink3Description: LCSC Part URL; ComponentLink3URL: https://lcsc.com/product-detail/Multilayer-Ceramic-Capacitors-MLCC---SMD-SMT_Murata-Electronics-Murata-Electronics-GJM0335C1E5R5BB01D_C2187712.html
footprint CAP-0201 (0201 (0603M) Capacitor)
pins: 1, 2

## GJM0335C1E5R6CB01D
designator C?  Capacitance: 5.6pF  (hidden comment: *)
Capacitor, Ceramic (MLCC), 5.6pF, 25V, C0G, SMD 0201; Manufacturer: Murata Electronics; Manufacturer Part Number: GJM0335C1E5R6CB01D; Package Size: 0201; JLCPCB Basic Part: No; JLCPCB Part Number: C380634; Supplier 1: LCSC; Category: Capacitors - MLCC; Supplier Part Number 1: C380634; Voltage Rating: 25V; Temperature Coefficient: C0G; RoHS: Yes; ComponentLink1Description: Datasheet; ComponentLink1URL: https://wmsc.lcsc.com/wmsc/upload/file/pdf/v2/lcsc/1912111437_Murata-Electronics-GJM0335C1E5R6CB01D_C380634.pdf; ComponentLink2Description: JLCPCB Part URL; ComponentLink2URL: https://jlcpcb.com/partdetail/C380634; ComponentLink3Description: LCSC Part URL; ComponentLink3URL: https://lcsc.com/product-detail/Multilayer-Ceramic-Capacitors-MLCC---SMD-SMT_Murata-Electronics-Murata-Electronics-GJM0335C1E5R6CB01D_C380634.html
footprint CAP-0201 (0201 (0603M) Capacitor)
pins: 1, 2

## GJM0335C1E5R7BB01D
designator C?  Capacitance: 5.7pF  (hidden comment: *)
Capacitor, Ceramic (MLCC), 5.7pF, 25V, null, SMD 0201; Manufacturer: Murata Electronics; Manufacturer Part Number: GJM0335C1E5R7BB01D; Package Size: 0201; JLCPCB Basic Part: No; JLCPCB Part Number: C2297397; Supplier 1: LCSC; Category: Capacitors - MLCC; Supplier Part Number 1: C2297397; Voltage Rating: 25V; Temperature Coefficient: null; RoHS: Yes; ComponentLink1Description: Datasheet; ComponentLink1URL: https://wmsc.lcsc.com/wmsc/upload/file/pdf/v2/lcsc/2104190939_Murata-Electronics-GJM0335C1E5R7BB01D_C2297397.pdf; ComponentLink2Description: JLCPCB Part URL; ComponentLink2URL: https://jlcpcb.com/partdetail/C2297397; ComponentLink3Description: LCSC Part URL; ComponentLink3URL: https://lcsc.com/product-detail/Multilayer-Ceramic-Capacitors-MLCC---SMD-SMT_Murata-Electronics-Murata-Electronics-GJM0335C1E5R7BB01D_C2297397.html
footprint CAP-0201 (0201 (0603M) Capacitor)
pins: 1, 2

## GJM0335C1E6R2BB01D
designator C?  Capacitance: 6.2pF  (hidden comment: *)
Capacitor, Ceramic (MLCC), 6.2pF, 25V, null, SMD 0201; Manufacturer: Murata Electronics; Manufacturer Part Number: GJM0335C1E6R2BB01D; Package Size: 0201; JLCPCB Basic Part: No; JLCPCB Part Number: C710740; Supplier 1: LCSC; Category: Capacitors - MLCC; Supplier Part Number 1: C710740; Voltage Rating: 25V; Temperature Coefficient: null; RoHS: Yes; ComponentLink1Description: Datasheet; ComponentLink1URL: https://wmsc.lcsc.com/wmsc/upload/file/pdf/v2/lcsc/2101281807_Murata-Electronics-GJM0335C1E6R2BB01D_C710740.pdf; ComponentLink2Description: JLCPCB Part URL; ComponentLink2URL: https://jlcpcb.com/partdetail/C710740; ComponentLink3Description: LCSC Part URL; ComponentLink3URL: https://lcsc.com/product-detail/Multilayer-Ceramic-Capacitors-MLCC---SMD-SMT_Murata-Electronics-Murata-Electronics-GJM0335C1E6R2BB01D_C710740.html
footprint CAP-0201 (0201 (0603M) Capacitor)
pins: 1, 2

## GJM0335C1E6R8CB01D
designator C?  Capacitance: 6.8pF  (hidden comment: *)
Capacitor, Ceramic (MLCC), 6.8pF, 25V, C0G, SMD 0201; Manufacturer: Murata Electronics; Manufacturer Part Number: GJM0335C1E6R8CB01D; Package Size: 0201; JLCPCB Basic Part: No; JLCPCB Part Number: C415404; Supplier 1: LCSC; Category: Capacitors - MLCC; Supplier Part Number 1: C415404; Voltage Rating: 25V; Temperature Coefficient: C0G; RoHS: Yes; ComponentLink1Description: Datasheet; ComponentLink1URL: https://wmsc.lcsc.com/wmsc/upload/file/pdf/v2/lcsc/2304140030_Murata-Electronics-GJM0335C1E6R8CB01D_C415404.pdf; ComponentLink2Description: JLCPCB Part URL; ComponentLink2URL: https://jlcpcb.com/partdetail/C415404; ComponentLink3Description: LCSC Part URL; ComponentLink3URL: https://lcsc.com/product-detail/Multilayer-Ceramic-Capacitors-MLCC---SMD-SMT_Murata-Electronics-Murata-Electronics-GJM0335C1E6R8CB01D_C415404.html
footprint CAP-0201 (0201 (0603M) Capacitor)
pins: 1, 2

## GJM0335C1E6R8DB01D
designator C?  Capacitance: 6.8pF  (hidden comment: *)
Capacitor, Ceramic (MLCC), 6.8pF, 25V, null, SMD 0201; Manufacturer: Murata Electronics; Manufacturer Part Number: GJM0335C1E6R8DB01D; Package Size: 0201; JLCPCB Basic Part: No; JLCPCB Part Number: C913657; Supplier 1: LCSC; Category: Capacitors - MLCC; Supplier Part Number 1: C913657; Voltage Rating: 25V; Temperature Coefficient: null; RoHS: Yes; ComponentLink1Description: Datasheet; ComponentLink1URL: https://wmsc.lcsc.com/wmsc/upload/file/pdf/v2/lcsc/2308111614_Murata-Electronics-GJM0335C1E6R8DB01D_C913657.pdf; ComponentLink2Description: JLCPCB Part URL; ComponentLink2URL: https://jlcpcb.com/partdetail/C913657; ComponentLink3Description: LCSC Part URL; ComponentLink3URL: https://lcsc.com/product-detail/Multilayer-Ceramic-Capacitors-MLCC---SMD-SMT_Murata-Electronics-Murata-Electronics-GJM0335C1E6R8DB01D_C913657.html
footprint CAP-0201 (0201 (0603M) Capacitor)
pins: 1, 2

## GJM0335C1E8R0BB01D
designator C?  Capacitance: 8pF  (hidden comment: *)
Capacitor, Ceramic (MLCC), 8pF, 25V, C0G, SMD 0201; Manufacturer: Murata Electronics; Manufacturer Part Number: GJM0335C1E8R0BB01D; Package Size: 0201; JLCPCB Basic Part: No; JLCPCB Part Number: C237455; Supplier 1: LCSC; Category: Capacitors - MLCC; Supplier Part Number 1: C237455; Voltage Rating: 25V; Temperature Coefficient: C0G; RoHS: Yes; ComponentLink1Description: Datasheet; ComponentLink1URL: https://wmsc.lcsc.com/wmsc/upload/file/pdf/v2/lcsc/1912111437_Murata-Electronics-GJM0335C1E8R0BB01D_C237455.pdf; ComponentLink2Description: JLCPCB Part URL; ComponentLink2URL: https://jlcpcb.com/partdetail/C237455; ComponentLink3Description: LCSC Part URL; ComponentLink3URL: https://lcsc.com/product-detail/Multilayer-Ceramic-Capacitors-MLCC---SMD-SMT_Murata-Electronics-Murata-Electronics-GJM0335C1E8R0BB01D_C237455.html
footprint CAP-0201 (0201 (0603M) Capacitor)
pins: 1, 2

## GJM0335C1E8R4BB01D
designator C?  Capacitance: 8.4pF  (hidden comment: *)
Capacitor, Ceramic (MLCC), 8.4pF, 25V, C0G, SMD 0201; Manufacturer: Murata Electronics; Manufacturer Part Number: GJM0335C1E8R4BB01D; Package Size: 0201; JLCPCB Basic Part: No; JLCPCB Part Number: C3019000; Supplier 1: LCSC; Category: Capacitors - MLCC; Supplier Part Number 1: C3019000; Voltage Rating: 25V; Temperature Coefficient: C0G; RoHS: Yes; ComponentLink1Description: Datasheet; ComponentLink1URL: https://wmsc.lcsc.com/wmsc/upload/file/pdf/v2/lcsc/2205191730_Murata-Electronics-GJM0335C1E8R4BB01D_C3019000.pdf; ComponentLink2Description: JLCPCB Part URL; ComponentLink2URL: https://jlcpcb.com/partdetail/C3019000; ComponentLink3Description: LCSC Part URL; ComponentLink3URL: https://lcsc.com/product-detail/Multilayer-Ceramic-Capacitors-MLCC---SMD-SMT_Murata-Electronics-Murata-Electronics-GJM0335C1E8R4BB01D_C3019000.html
footprint CAP-0201 (0201 (0603M) Capacitor)
pins: 1, 2

## GJM0335C1E8R6BB01D
designator C?  Capacitance: 8.6pF  (hidden comment: *)
Capacitor, Ceramic (MLCC), 8.6pF, 25V, C0G, SMD 0201; Manufacturer: Murata Electronics; Manufacturer Part Number: GJM0335C1E8R6BB01D; Package Size: 0201; JLCPCB Basic Part: No; JLCPCB Part Number: C3018998; Supplier 1: LCSC; Category: Capacitors - MLCC; Supplier Part Number 1: C3018998; Voltage Rating: 25V; Temperature Coefficient: C0G; RoHS: Yes; ComponentLink1Description: Datasheet; ComponentLink1URL: https://wmsc.lcsc.com/wmsc/upload/file/pdf/v2/lcsc/2205191730_Murata-Electronics-GJM0335C1E8R6BB01D_C3018998.pdf; ComponentLink2Description: JLCPCB Part URL; ComponentLink2URL: https://jlcpcb.com/partdetail/C3018998; ComponentLink3Description: LCSC Part URL; ComponentLink3URL: https://lcsc.com/product-detail/Multilayer-Ceramic-Capacitors-MLCC---SMD-SMT_Murata-Electronics-Murata-Electronics-GJM0335C1E8R6BB01D_C3018998.html
footprint CAP-0201 (0201 (0603M) Capacitor)
pins: 1, 2

## GJM0335C1E9R1CB01D
designator C?  Capacitance: 9.1pF  (hidden comment: *)
Capacitor, Ceramic (MLCC), 9.1pF, 25V, null, SMD 0201; Manufacturer: Murata Electronics; Manufacturer Part Number: GJM0335C1E9R1CB01D; Package Size: 0201; JLCPCB Basic Part: No; JLCPCB Part Number: C2181211; Supplier 1: LCSC; Category: Capacitors - MLCC; Supplier Part Number 1: C2181211; Voltage Rating: 25V; Temperature Coefficient: null; RoHS: Yes; ComponentLink1Description: Datasheet; ComponentLink1URL: https://wmsc.lcsc.com/wmsc/upload/file/pdf/v2/lcsc/2304140030_Murata-Electronics-GJM0335C1E9R1CB01D_C2181211.pdf; ComponentLink2Description: JLCPCB Part URL; ComponentLink2URL: https://jlcpcb.com/partdetail/C2181211; ComponentLink3Description: LCSC Part URL; ComponentLink3URL: https://lcsc.com/product-detail/Multilayer-Ceramic-Capacitors-MLCC---SMD-SMT_Murata-Electronics-Murata-Electronics-GJM0335C1E9R1CB01D_C2181211.html
footprint CAP-0201 (0201 (0603M) Capacitor)
pins: 1, 2
